# Altium footprint library THD Connectors-2.PcbLib: 84 footprints (part 3 of 6)
Each footprint in its own frame and in the unit in brackets; x right, y up, seen from the top. Pads: shape width x height; smd on the part's side, far side on the other; paste and mask are expansions set on the pad; w line width, h text height; cw(c..) or ccw(c..) is an arc to the next point about the centre after c.
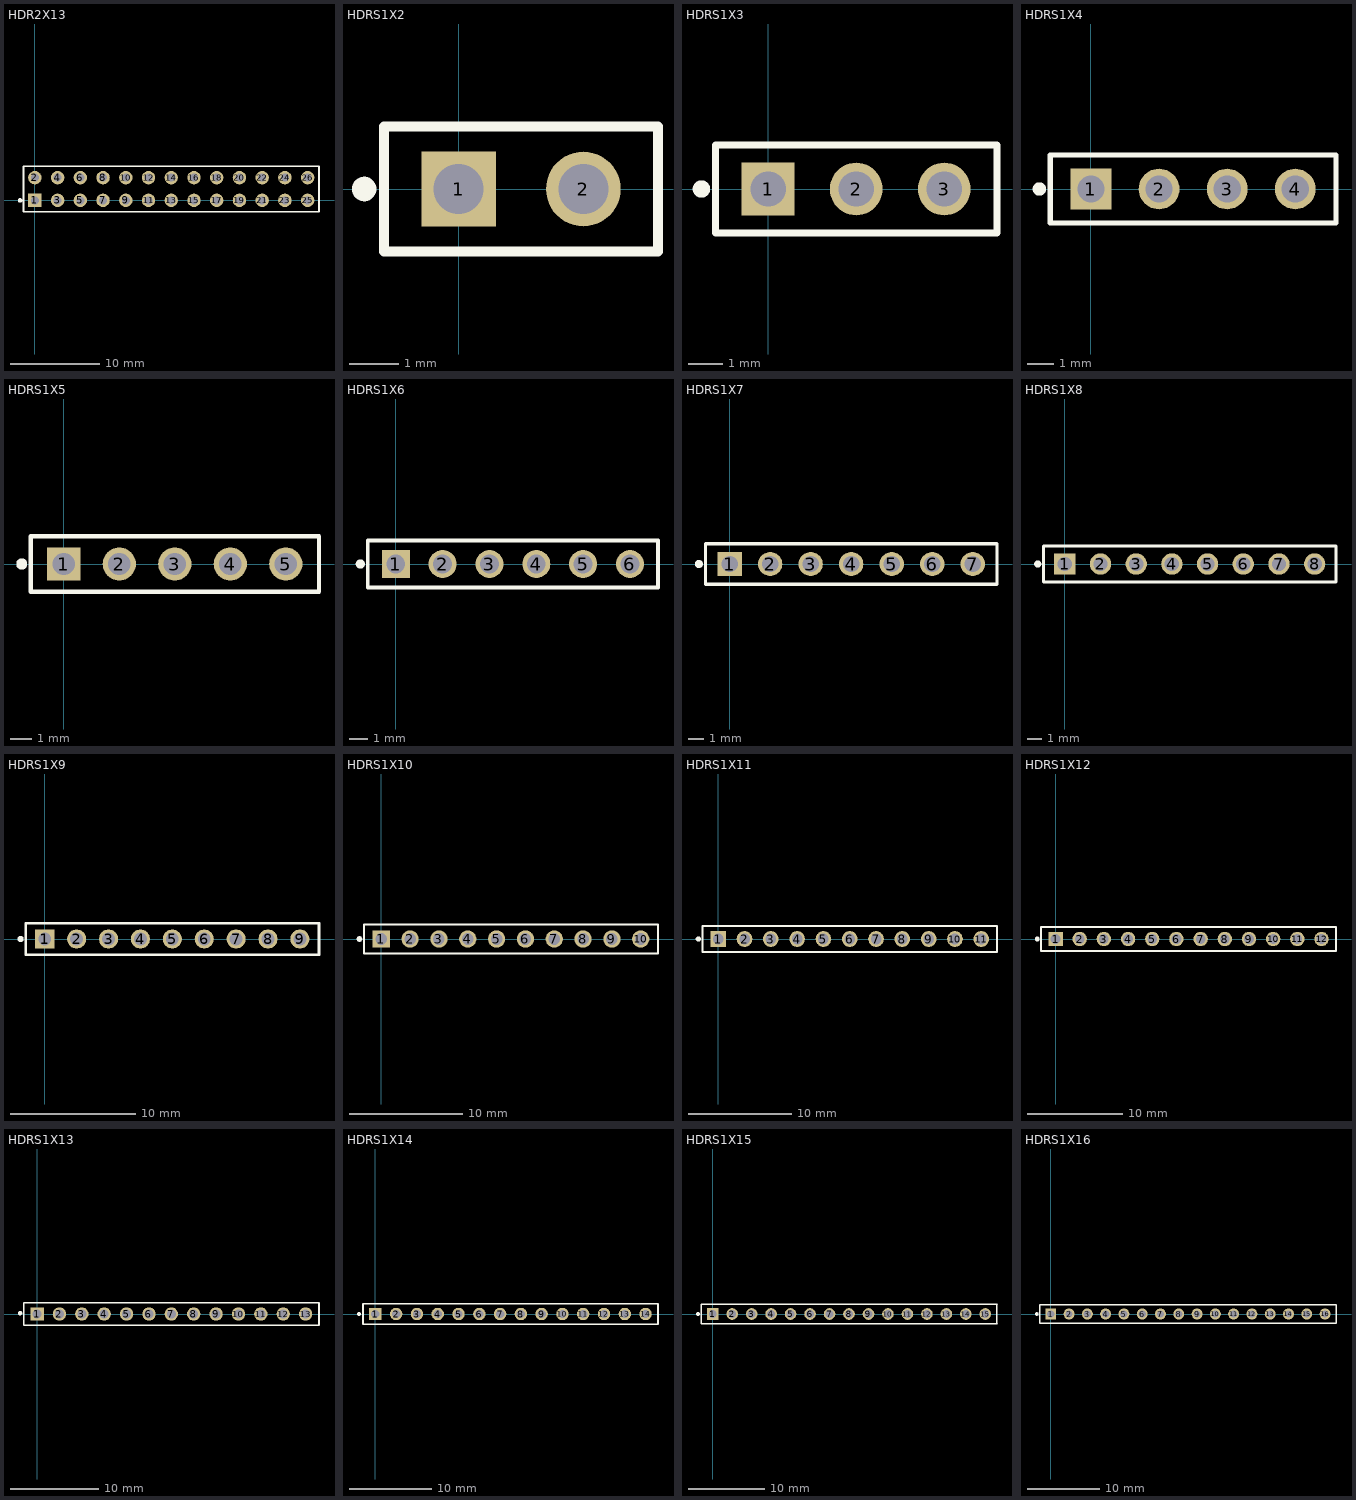
[diagram p2: the footprints below, top view; thin cyan lines are the x and y axes]

## HDR2X13 [mm] "Connector; Header; 2x13 Position"
pads (26):
  rect 1.5x1.5 hole 0.9: 1(0,0)
  round 1.5 hole 0.9: 2(0,2.54) 3(2.54,0) 4(2.54,2.54) 5(5.08,0) 6(5.08,2.54) 7(7.62,0) 8(7.62,2.54) 9(10.16,0) 10(10.16,2.54) 11(12.7,0) 12(12.7,2.54) 13(15.24,0) 14(15.24,2.54) 15(17.78,0) 16(17.78,2.54) 17(20.32,0) 18(20.32,2.54) 19(22.86,0) 20(22.86,2.54) 21(25.4,0) 22(25.4,2.54) 23(27.94,0) 24(27.94,2.54) 25(30.48,0) 26(30.48,2.54)
Top Overlay:
  circle w0.25: c-1.649,0 r0.125
  lines w0.2: -1.27,-1.27 -1.27,3.81 31.75,3.81 31.75,-1.27 -1.27,-1.27
3D body "Pin Header 2x3 TH Pitch 2.54mm.stp": height 9.5, standoff -3.2, extent -1.27,-1.24 6.35,3.84
3D body "Pin Header 2x3 TH Pitch 2.54mm.stp": height 9.5, standoff -3.2, extent 6.35,-1.24 13.97,3.84
3D body "Pin Header 2x3 TH Pitch 2.54mm.stp": height 9.5, standoff -3.2, extent 13.97,-1.24 21.59,3.84
3D body "Pin Header 2x2 TH Pitch 2.54mm.stp": height 9.5, standoff -3.2, extent 21.59,-1.24 26.67,3.84
3D body "Pin Header 2x2 TH Pitch 2.54mm.stp": height 9.5, standoff -3.2, extent 26.67,-1.24 31.75,3.84

## HDRS1X2 [mm] "Connector; Socket Header; 2 Position"
height 8.5
pads (2):
  rect 1.52x1.52 hole 1.02: 1(0,0)
  round 1.52 hole 1.02: 2(2.54,0)
Top Overlay:
  circle w0.25: c-1.925,0 r0.125
  lines w0.2: -1.52,-1.27 4.06,-1.27 4.06,1.27 -1.52,1.27 -1.52,-1.27
3D body "61300211821.stp": height 8.51, standoff -3.09, extent -1.52,-1.25 4.06,1.25

## HDRS1X3 [mm] "Connector; Socket Header; 3 Position"
height 8.5
pads (3):
  rect 1.52x1.52 hole 1.02: 1(0,0)
  round 1.52 hole 1.02: 2(2.54,0) 3(5.08,0)
Top Overlay:
  circle w0.25: c-1.925,0 r0.125
  lines w0.2: -1.52,-1.27 -1.52,1.27 6.6,1.27 6.6,-1.27 -1.52,-1.27
3D body "61300311821.stp": height 8.51, standoff -3.09, extent -1.52,-1.25 6.6,1.25

## HDRS1X4 [mm] "Connector; Socket Header; 4 Position"
height 8.5
pads (4):
  rect 1.52x1.52 hole 1.02: 1(0,0)
  round 1.52 hole 1.02: 2(2.54,0) 3(5.08,0) 4(7.62,0)
Top Overlay:
  circle w0.25: c-1.925,0 r0.125
  lines w0.2: -1.52,-1.27 9.14,-1.27 9.14,1.27 -1.52,1.27 -1.52,-1.27
3D body "61300411821.stp": height 8.51, standoff -3.09, extent -1.52,-1.25 9.14,1.25

## HDRS1X5 [mm] "Connector; Socket Header; 6 Position"
height 8.5
pads (5):
  rect 1.52x1.52 hole 1.02: 1(0,0)
  round 1.52 hole 1.02: 2(2.54,0) 3(5.08,0) 4(7.62,0) 5(10.16,0)
Top Overlay:
  circle w0.25: c-1.925,0 r0.125
  lines w0.2: -1.52,-1.27 11.68,-1.27 11.68,1.27 -1.52,1.27 -1.52,-1.27
3D body "61300511821.stp": height 8.51, standoff -3.09, extent -1.52,-1.25 11.68,1.25

## HDRS1X6 [mm] "Connector; Socket Header; 6 Position"
height 8.5
pads (6):
  rect 1.52x1.52 hole 1.02: 1(0,0)
  round 1.52 hole 1.02: 2(2.54,0) 3(5.08,0) 4(7.62,0) 5(10.16,0) 6(12.7,0)
Top Overlay:
  circle w0.25: c-1.925,0 r0.125
  lines w0.2: -1.52,-1.27 -1.52,1.27 14.22,1.27 14.22,-1.27 -1.52,-1.27
3D body "61300611821.stp": height 8.51, standoff -3.09, extent -1.52,-1.25 14.22,1.25

## HDRS1X7 [mm] "Connector; Socket Header; 7 Position"
height 8.5
pads (7):
  rect 1.52x1.52 hole 1.02: 1(0,0)
  round 1.52 hole 1.02: 2(2.54,0) 3(5.08,0) 4(7.62,0) 5(10.16,0) 6(12.7,0) 7(15.24,0)
Top Overlay:
  circle w0.25: c-1.925,0 r0.125
  lines w0.2: -1.52,-1.27 16.76,-1.27 16.76,1.27 -1.52,1.27 -1.52,-1.27
3D body "61300711821.stp": height 8.51, standoff -3.09, extent -1.52,-1.25 16.76,1.25

## HDRS1X8 [mm] "Connector; Socket Header; 8 Position"
height 8.5
pads (8):
  rect 1.52x1.52 hole 1.02: 1(0,0)
  round 1.52 hole 1.02: 2(2.54,0) 3(5.08,0) 4(7.62,0) 5(10.16,0) 6(12.7,0) 7(15.24,0) 8(17.78,0)
Top Overlay:
  circle w0.25: c-1.925,0 r0.125
  lines w0.2: -1.52,-1.27 19.3,-1.27 19.3,1.27 -1.52,1.27 -1.52,-1.27
3D body "61300811821.stp": height 8.51, standoff -3.09, extent -1.52,-1.25 19.3,1.25

## HDRS1X9 [mm] "Connector; Socket Header; 9 Position"
height 8.5
pads (9):
  rect 1.52x1.52 hole 1.02: 1(0,0)
  round 1.52 hole 1.02: 2(2.54,0) 3(5.08,0) 4(7.62,0) 5(10.16,0) 6(12.7,0) 7(15.24,0) 8(17.78,0) 9(20.32,0)
Top Overlay:
  circle w0.25: c-1.925,0 r0.125
  lines w0.2: -1.52,-1.27 21.84,-1.27 21.84,1.27 -1.52,1.27 -1.52,-1.27
3D body "61300911821.stp": height 8.51, standoff -3.09, extent -1.52,-1.25 21.84,1.25

## HDRS1X10 [mm] "Connector; Socket Header; 10 Position"
height 8.5
pads (10):
  rect 1.52x1.52 hole 1.02: 1(0,0)
  round 1.52 hole 1.02: 2(2.54,0) 3(5.08,0) 4(7.62,0) 5(10.16,0) 6(12.7,0) 7(15.24,0) 8(17.78,0) 9(20.32,0) 10(22.86,0)
Top Overlay:
  circle w0.25: c-1.925,0 r0.125
  lines w0.2: -1.52,-1.27 -1.52,1.27 0.635,1.27 24.38,1.27 24.38,-1.27 -1.52,-1.27
3D body "61301011821.stp": height 8.51, standoff -3.09, extent -1.52,-1.25 24.38,1.25

## HDRS1X11 [mm] "Connector; Socket Header; 11 Position"
height 8.5
pads (11):
  rect 1.52x1.52 hole 1.02: 1(0,0)
  round 1.52 hole 1.02: 2(2.54,0) 3(5.08,0) 4(7.62,0) 5(10.16,0) 6(12.7,0) 7(15.24,0) 8(17.78,0) 9(20.32,0) 10(22.86,0) 11(25.4,0)
Top Overlay:
  circle w0.25: c-1.925,0 r0.125
  lines w0.2: -1.52,-1.27 26.92,-1.27 26.92,1.27 0.635,1.27 -1.52,1.27 -1.52,-1.27
3D body "61301111821.stp": height 8.51, standoff -3.09, extent -1.52,-1.27 26.92,1.23

## HDRS1X12 [mm] "Connector; Socket Header; 12 Position"
height 8.5
pads (12):
  rect 1.52x1.52 hole 1.02: 1(0,0)
  round 1.52 hole 1.02: 2(2.54,0) 3(5.08,0) 4(7.62,0) 5(10.16,0) 6(12.7,0) 7(15.24,0) 8(17.78,0) 9(20.32,0) 10(22.86,0) 11(25.4,0) 12(27.94,0)
Top Overlay:
  circle w0.25: c-1.925,0 r0.125
  lines w0.2: -1.52,-1.27 29.46,-1.27 29.46,1.27 0.635,1.27 -1.52,1.27 -1.52,-1.27
3D body "61301211821.stp": height 8.51, standoff -3.09, extent -1.52,-1.25 29.46,1.25

## HDRS1X13 [mm] "Connector; Socket Header; 13 Position"
height 8.5
pads (13):
  rect 1.52x1.52 hole 1.02: 1(0,0)
  round 1.52 hole 1.02: 2(2.54,0) 3(5.08,0) 4(7.62,0) 5(10.16,0) 6(12.7,0) 7(15.24,0) 8(17.78,0) 9(20.32,0) 10(22.86,0) 11(25.4,0) 12(27.94,0) 13(30.48,0)
Top Overlay:
  circle w0.25: c-1.925,0.1 r0.125
  lines w0.2: -1.52,-1.25 -1.52,1.27 32,1.27 32,-1.27 -1.504,-1.27
3D body "61301311821.stp": height 8.51, standoff -3.09, extent -1.524,-1.25 31.496,1.25

## HDRS1X14 [mm] "Connector; Socket Header; 14 Position"
height 8.5
pads (14):
  rect 1.52x1.52 hole 1.02: 1(0,0)
  round 1.52 hole 1.02: 2(2.54,0) 3(5.08,0) 4(7.62,0) 5(10.16,0) 6(12.7,0) 7(15.24,0) 8(17.78,0) 9(20.32,0) 10(22.86,0) 11(25.4,0) 12(27.94,0) 13(30.48,0) 14(33.02,0)
Top Overlay:
  circle w0.25: c-2,0 r0.125
  lines w0.2: -1.52,-1.27 34.54,-1.27 34.54,1.27 0.635,1.27 -1.52,1.27 -1.52,-1.27
3D body "61301411821.stp": height 8.51, standoff -3.09, extent -1.52,-1.25 34.54,1.25

## HDRS1X15 [mm] "Connector; Socket Header; 15 Position"
height 8.5
pads (15):
  rect 1.52x1.52 hole 1.02: 1(0,0)
  round 1.52 hole 1.02: 2(2.54,0) 3(5.08,0) 4(7.62,0) 5(10.16,0) 6(12.7,0) 7(15.24,0) 8(17.78,0) 9(20.32,0) 10(22.86,0) 11(25.4,0) 12(27.94,0) 13(30.48,0) 14(33.02,0) 15(35.56,0)
Top Overlay:
  circle w0.25: c-1.925,0 r0.125
  lines w0.2: -1.524,-1.27 37.084,-1.27 ; -1.524,1.27 0.635,1.27 37.084,1.27 ; -1.52,-1.27 -1.52,1.27 ; 37.08,-1.27 37.08,1.27
3D body "61301511821.stp": height 8.51, standoff -3.09, extent -1.524,-1.25 36.576,1.25

## HDRS1X16 [mm] "Connector; Socket Header; 16 Position"
height 8.5
pads (16):
  rect 1.52x1.52 hole 1.02: 1(0,0)
  round 1.52 hole 1.02: 2(2.54,0) 3(5.08,0) 4(7.62,0) 5(10.16,0) 6(12.7,0) 7(15.24,0) 8(17.78,0) 9(20.32,0) 10(22.86,0) 11(25.4,0) 12(27.94,0) 13(30.48,0) 14(33.02,0) 15(35.56,0) 16(38.1,0)
Top Overlay:
  circle w0.25: c-1.925,0 r0.125
  lines w0.2: -1.52,-1.27 39.62,-1.27 39.62,1.27 0.635,1.27 -1.52,1.27 -1.52,-1.27
3D body "61301611821.stp": height 8.51, standoff -3.09, extent -1.52,-1.25 39.62,1.25